# Altium footprint library LimeMicroAltiumLib_pcbLib.PcbLib: 281 footprints (part 18 of 18)
Each footprint in its own frame and in the unit in brackets; x right, y up, seen from the top. Pads: shape width x height; smd on the part's side, far side on the other; paste and mask are expansions set on the pad; w line width, h text height; cw(c..) or ccw(c..) is an arc to the next point about the centre after c.
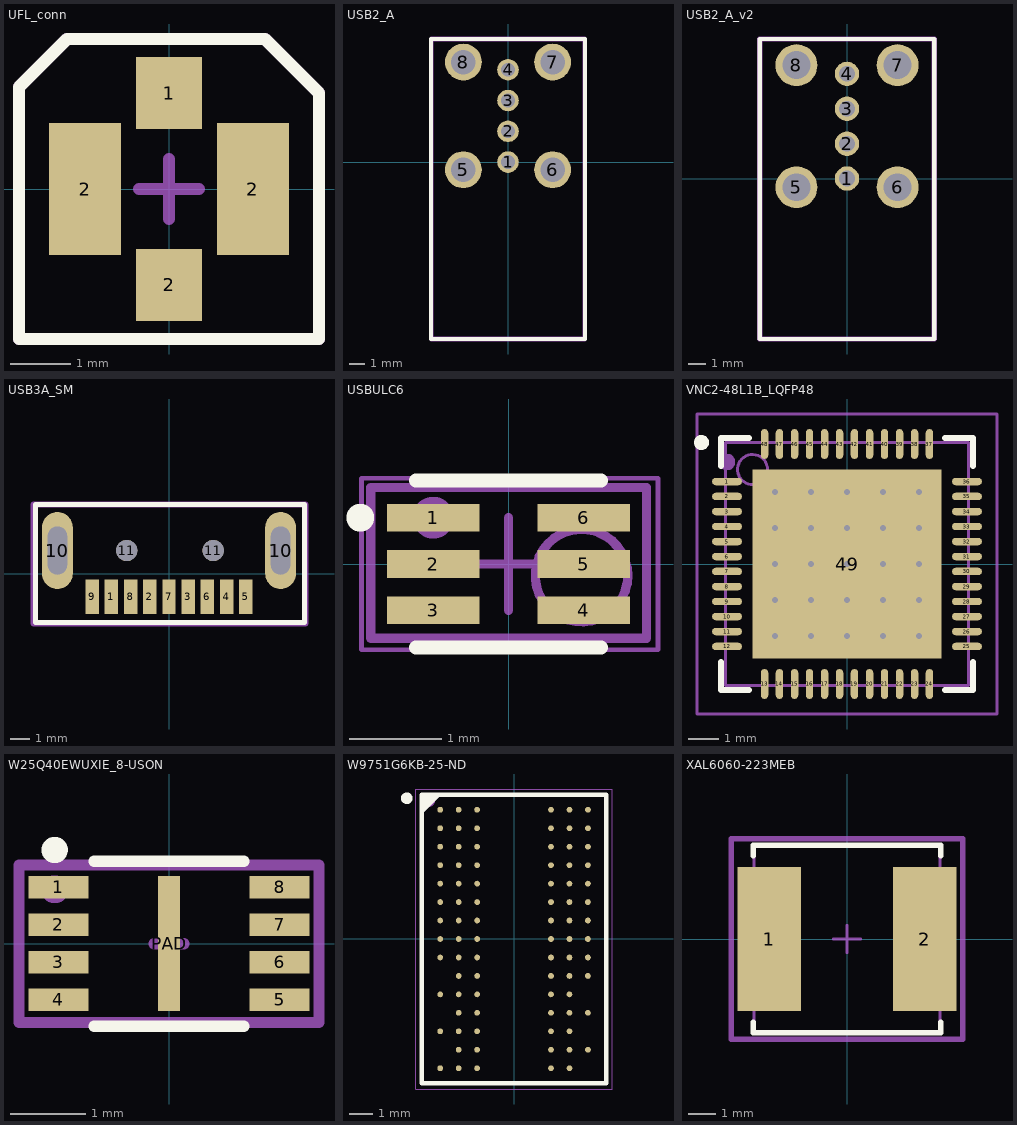
[diagram p17: the footprints below, top view; thin cyan lines are the x and y axes]

## UFL_conn [mm]
pads (4):
  rect 1.1x1.2 smd: 1(0,1.6) 2(0,-1.6)
  rect 1.2x2.2 smd: 2(-1.4,0) 2(1.4,0)
Top Overlay:
  lines w0.2: -2.5,-2.5 -2.5,1.7 -1.7,2.5 1.6,2.5 2.5,1.6 2.5,-2.5 -2.5,-2.5
Mechanical 15:
  lines w0.2: -0.5,0 0.5,0 ; 0,-0.5 0,0.5 ; -2.5,-2.5 2.5,-2.5 2.5,1.6 1.6,2.5 -1.7,2.5 -2.5,1.7 -2.5,-2.5
  text "in" at -0.7,1.3 h0.9
  text ".designator" at 0,0 h0.9
3D body "User Library-U_FL-R-SMT-1.step": height 1.25, standoff -0.01, extent -1.55,-1.5 1.55,1.5

## USB2_A [mm]
pads (8):
  round 1.4 hole 0.9: 1(0,0) 2(0,2) 3(0,4) 4(0,6)
  round 2.4 hole 1.6: 5(-2.9,-0.5) 6(2.9,-0.5) 7(2.9,6.5) 8(-2.9,6.5)
Top Overlay:
  lines w0.254: -5,-11.5 5,-11.5 5,8 -5,8 -5,-11.5
Mechanical 15:
  lines w0.3: -5,-11.5 5,-11.5 5,8 -5,8 -5,-11.5
  text ".Designator" at 0,0 h0.7

## USB2_A_v2 [mm]
pads (8):
  round 1.4 hole 0.9: 1(0,0) 2(0,2) 3(0,4) 4(0,6)
  round 2.4 hole 1.6: 5(-2.9,-0.5) 6(2.9,-0.5) 7(2.9,6.5) 8(-2.9,6.5)
Top Overlay:
  lines w0.254: -5,-9.2 -5,8 5,8 5,-9.2 -5,-9.2
Mechanical 15:
  lines w0.3: -5,-9.2 5,-9.2 5,8 -5,8 -5,-9.2
  text ".Designator" at 0,0 h0.7

## USB3A_SM [mm]
pads (13):
  rect 0.7x1.8 smd: 1(-3,-1.2) 2(-1,-1.2) 3(1,-1.2) 4(3,-1.2) 5(4,-1.2) 6(2,-1.2) 7(0,-1.2) 8(-2,-1.2) 9(-4,-1.2)
  oval 1.6x4 hole 1 slot 2.5 at 90 deg: 10(-5.8,1.2) 10(5.8,1.2)
  round 1.1 hole 1.1 unplated: 11(-2.2,1.2) 11(2.3,1.2)
Top Overlay:
  lines w0.254: -6.95,-2.55 7.05,-2.55 7.05,3.6 -6.95,3.6 -6.95,-2.55
Mechanical 15:
  lines w0.3: -7.05,-2.6 7.1,-2.6 7.1,3.6 -7.05,3.6 -7.05,-2.6
  text ".Designator" at -0.2,0.3 h0.7
3D body "692112030100.stp": height 1.8, standoff -2.7, extent -6,-1.754 6,19

## USBULC6 [mm]
height 1.2
pads (6):
  rect 1x0.3 smd mask+0.07: 1(-0.812,0.5) 2(-0.812,0) 3(-0.812,-0.5) 4(0.813,-0.5) 5(0.813,0) 6(0.813,0.5)
Top Overlay:
  circle w0.25: c-1.6,0.5 r0.025
  lines w0.15: -1,-0.9 1,-0.9 ; -1,0.9 1,0.9
Mechanical 13:
  circle w0.1: c0.788,-0.125 r0.5
  lines w0.1: -1.487,-0.8 -1.487,0.825 1.488,0.825 1.488,-0.8 -1.487,-0.8
Mechanical 15:
  circle w0.35: c-0.812,0.5 r0.05
  lines w0.05: -1.587,-0.925 -1.587,0.925 1.613,0.925 1.613,-0.925 -1.587,-0.925
  lines w0.1: -0.5,0 0.5,0 ; 0,-0.5 0,0.5
  text ".Designator" at 0,0 h0.7
3D body: height 1.5, standoff 0, extent -0.825,-0.5 0.825,0.5

## uSpark_BODY1_MECH [mm]
3D body "1455A1202.stp": height 4.37, standoff -7.63, extent -73.5,-33.291 52.5,36.711
3D body "User Library-SMA Antenna.step": height 81.97, standoff -5, extent 52.475,-10.425 83.375,-0.425
3D body "User Library-SMA Antenna.step": height 81.97, standoff -5, extent 52.475,-24.75 83.375,-14.75
3D body "User Library-SMA Antenna.step": height 81.97, standoff -5, extent 52.475,3.325 83.375,13.325
3D body "User Library-SMA Antenna.step": height 81.97, standoff -5, extent 52.5,17.65 83.4,27.65

## uSpark_BODY_MECH [mm]
3D body "User Library-SMA Antenna.step": height 86.97, standoff 0, extent 52.475,-10.425 83.375,-0.425
3D body "User Library-SMA Antenna.step": height 86.97, standoff 0, extent 52.475,-24.75 83.375,-14.75
3D body "User Library-SMA Antenna.step": height 86.97, standoff 0, extent 52.475,3.325 83.375,13.325
3D body "User Library-SMA Antenna.step": height 86.97, standoff 0, extent 52.5,17.65 83.4,27.65
3D body "1455A1002.stp": height 9.37, standoff -2.63, extent -53.525,-34.611 52.475,35.391

## uSpark_BODY_PANEL_MECH [mm]
3D body: height 6, standoff 0, extent 50,-26 51.5,29
3D body "User Library-SMA-2.step": height 8.25, standoff -2.25, extent 23.85,-25.025 58.85,-14.525
3D body "User Library-SMA-2.step": height 8.25, standoff -2.25, extent 23.85,-10.7 58.85,-0.2
3D body "User Library-SMA-2.step": height 8.25, standoff -2.25, extent 23.85,3.05 58.85,13.55
3D body "User Library-SMA-2.step": height 8.25, standoff -2.25, extent 23.875,17.375 58.875,27.875
3D body "User Library-SMA Antenna.step": height 84.97, standoff -2, extent 52.475,-10.425 83.375,-0.425
3D body "User Library-SMA Antenna.step": height 84.97, standoff -2, extent 52.475,-24.75 83.375,-14.75
3D body "User Library-SMA Antenna.step": height 84.97, standoff -2, extent 52.475,3.325 83.375,13.325
3D body "User Library-SMA Antenna.step": height 84.97, standoff -2, extent 52.5,17.65 83.4,27.65

## VNC2-48L1B_LQFP48 [mm] "VNC2-48L1B chip with LQFP-48 package"
pads (49):
  oval 1x0.25 smd: 1(-4,2.75) 2(-4,2.25) 3(-4,1.75) 4(-4,1.25) 5(-4,0.75) 6(-4,0.25) 7(-4,-0.25) 8(-4,-0.75) 9(-4,-1.25) 10(-4,-1.75) 11(-4,-2.25) 12(-4,-2.75) 25(4,-2.75) 26(4,-2.25) 27(4,-1.75) 28(4,-1.25) 29(4,-0.75) 30(4,-0.25) 31(4,0.25) 32(4,0.75) 33(4,1.25) 34(4,1.75) 35(4,2.25) 36(4,2.75)
  oval 0.25x1 smd: 13(-2.75,-4) 14(-2.25,-4) 15(-1.75,-4) 16(-1.25,-4) 17(-0.75,-4) 18(-0.25,-4) 19(0.25,-4) 20(0.75,-4) 21(1.25,-4) 22(1.75,-4) 23(2.25,-4) 24(2.75,-4) 37(2.75,4) 38(2.25,4) 39(1.75,4) 40(1.25,4) 41(0.75,4) 42(0.25,4) 43(-0.25,4) 44(-0.75,4) 45(-1.25,4) 46(-1.75,4) 47(-2.25,4) 48(-2.75,4)
  rect 6.3x6.3 smd: 49(0,0)
via 2.4,-2.4 diameter 0.4 hole 0.2
via 1.2,-2.4 diameter 0.4 hole 0.2
via 0,-2.4 diameter 0.4 hole 0.2
via -1.2,-2.4 diameter 0.4 hole 0.2
via -2.4,-2.4 diameter 0.4 hole 0.2
via 2.4,-1.2 diameter 0.4 hole 0.2
via 1.2,-1.2 diameter 0.4 hole 0.2
via 0,-1.2 diameter 0.4 hole 0.2
via -1.2,-1.2 diameter 0.4 hole 0.2
via -2.4,-1.2 diameter 0.4 hole 0.2
via 2.4,0 diameter 0.4 hole 0.2
via 1.2,0 diameter 0.4 hole 0.2
via 0,0 diameter 0.4 hole 0.2
via -1.2,0 diameter 0.4 hole 0.2
via -2.4,0 diameter 0.4 hole 0.2
via 2.4,1.2 diameter 0.4 hole 0.2
via 1.2,1.2 diameter 0.4 hole 0.2
via 0,1.2 diameter 0.4 hole 0.2
via -1.2,1.2 diameter 0.4 hole 0.2
via -2.4,1.2 diameter 0.4 hole 0.2
via 2.4,2.4 diameter 0.4 hole 0.2
via 1.2,2.4 diameter 0.4 hole 0.2
via 0,2.4 diameter 0.4 hole 0.2
via -1.2,2.4 diameter 0.4 hole 0.2
via -2.4,2.4 diameter 0.4 hole 0.2
Top Overlay:
  circle w0.25: c-4.85,4.05 r0.125
  lines w0.2: -4.2,-3.275 -4.2,-4.2 -3.275,-4.2 ; -4.2,3.275 -4.2,4.2 -3.275,4.2 ; 3.275,-4.2 4.2,-4.2 4.2,-3.275 ; 3.275,4.2 4.2,4.2 4.2,3.275
Mechanical 13:
  circle w0.1: c-3.15,3.15 r0.5
  lines w0.1: -4.05,-4.05 4.05,-4.05 4.05,4.05 -4.05,4.05 -4.05,-4.05
Mechanical 15:
  circle w0.35: c-4,3.4 r0.1
  lines w0.1: -0.5,0 0.5,0 ; 0,-0.5 0,0.5 ; -5,-5 5,-5 5,5 -5,5 -5,-5
  text ".Designator" at 0,0 h0.7
3D body: height 1, standoff 0, extent -4.05,-4.05 4.05,4.05

## W25Q40EWUXIE_8-USON [mm]
pads (9):
  rect 0.8x0.3 smd mask+0.05: 1(-1.475,0.75) 2(-1.475,0.25) 3(-1.475,-0.25) 4(-1.475,-0.75) 5(1.475,-0.75) 6(1.475,-0.25) 7(1.475,0.25) 8(1.475,0.75)
  rect 0.3x1.8 smd mask+0.05: PAD(0,0)
Top Overlay:
  circle w0.3: c-1.525,1.25 r0.025
  lines w0.15: -1,-1.1 1,-1.1 ; -1,1.1 1,1.1
Mechanical 15:
  circle w0.3: c-1.525,0.725 r0.035
  lines w0.15: -0.2,0 0.2,0 ; 0,-0.2 0,0.2 ; -2,-1.05 2,-1.05 2,1.05 -2,1.05 -2,-1.05
  text ".Designator" at 0,0 h0.55
3D body "User Library-8MA3.step": height 0.6, standoff 0, extent -1.51,-1 1.51,1

## W9751G6KB-25-ND [mm] "BGA, 84-Leads, Body 8,00x12,50mmx1,20mm, Pitch 0,80mm"
height 1.2
pads (84):
  round 0.25 smd: A1(-3.2,5.6) A2(-2.4,5.6) A3(-1.6,5.6) A7(1.6,5.6) A8(2.4,5.6) A9(3.2,5.6) B1(-3.2,4.8) B2(-2.4,4.8) B3(-1.6,4.8) B7(1.6,4.8) B8(2.4,4.8) B9(3.2,4.8) C1(-3.2,4) C2(-2.4,4) C3(-1.6,4) C7(1.6,4) C8(2.4,4) C9(3.2,4) D1(-3.2,3.2) D2(-2.4,3.2) D3(-1.6,3.2) D7(1.6,3.2) D8(2.4,3.2) D9(3.2,3.2) E1(-3.2,2.4) E2(-2.4,2.4) E3(-1.6,2.4) E7(1.6,2.4) E8(2.4,2.4) E9(3.2,2.4) F1(-3.2,1.6) F2(-2.4,1.6) F3(-1.6,1.6) F7(1.6,1.6) F8(2.4,1.6) F9(3.2,1.6) G1(-3.2,0.8) G2(-2.4,0.8) G3(-1.6,0.8) G7(1.6,0.8) G8(2.4,0.8) G9(3.2,0.8) H1(-3.2,0) H2(-2.4,0) H3(-1.6,0) H7(1.6,0) H8(2.4,0) H9(3.2,0) J1(-3.2,-0.8) J2(-2.4,-0.8) J3(-1.6,-0.8) J7(1.6,-0.8) J8(2.4,-0.8) J9(3.2,-0.8) K2(-2.4,-1.6) K3(-1.6,-1.6) K7(1.6,-1.6) K8(2.4,-1.6) K9(3.2,-1.6) L1(-3.2,-2.4) L2(-2.4,-2.4) L3(-1.6,-2.4) L7(1.6,-2.4) L8(2.4,-2.4) M2(-2.4,-3.2) M3(-1.6,-3.2) M7(1.6,-3.2) M8(2.4,-3.2) M9(3.2,-3.2) N1(-3.2,-4) N2(-2.4,-4) N3(-1.6,-4) N7(1.6,-4) N8(2.4,-4) P2(-2.4,-4.8) P3(-1.6,-4.8) P7(1.6,-4.8) P8(2.4,-4.8) P9(3.2,-4.8) R1(-3.2,-5.6) R2(-2.4,-5.6) R3(-1.6,-5.6) R7(1.6,-5.6) R8(2.4,-5.6)
Top Overlay:
  circle w0.25: c-4.65,6.1 r0.125
  region: -3.292,6.25 -4,5.542 -4,6.25
  lines w0.2: -4,5.542 -3.292,6.25 ; -4,-6.25 4,-6.25 4,6.25 -4,6.25 -4,-6.25
Mechanical 13:
  lines w0.1: -4,-6.25 4,-6.25 4,6.25 -4,6.25 -4,-6.25
Mechanical 15:
  circle w0.35: c-3.7,6 r0.1
  lines w0.05: -4.25,-6.5 4.25,-6.5 4.25,6.5 -4.25,6.5 -4.25,-6.5
  text ".Designator" at 0,0 h0.7
3D body: height 1.2, standoff 0.25, extent -4,-6.25 4,6.25

## WurthElectronic_RF_shield [mm] "Man. part nr.: 36003250"
height 3
3D body: height 2.8, standoff 0.1, extent 0.3,0 26.5,0.3
3D body: height 2.8, standoff 0.1, extent 0,0 0.3,26.5
3D body: height 2.8, standoff 0.1, extent 0,26.5 26.5,26.8
3D body: height 3.1, standoff 2.8, extent 0,0 26.8,26.8
3D body: height 2.8, standoff 0.1, extent 26.5,0 26.8,26.8

## XAL6060-223MEB [mm] "Precision Wire Wound Inductor, 2-Leads, Body 6,56x6,56mm, IPC Medium Density"
height 6.1
pads (2):
  rect 2.3x5.25 smd: 1(-2.825,0) 2(2.825,0)
Top Overlay:
  lines w0.2: -3.4,-3.025 -3.4,-3.4 3.4,-3.4 3.4,-3.025 ; -3.4,3.025 -3.4,3.4 3.4,3.4 3.4,3.025
Mechanical 13:
  lines w0.1: -3.38,-3.38 3.38,-3.38 3.38,3.38 -3.38,3.38 -3.38,-3.38
Mechanical 15:
  lines w0.1: -0.5,0 0.5,0 ; 0,-0.5 0,0.5
  lines w0.2: -4.2,-3.65 4.2,-3.65 4.2,3.65 -4.2,3.65 -4.2,-3.65
  text ".Designator" at 0,0 h0.7
  text "no polarity" at -3.6,-2.5 h0.7
3D body "Cooper Bussman DR73 Series Inductor.STEP": height 3.55, standoff 0, extent -3.8,-3.8 3.8,3.8